# Altium footprint library Selex_PCBLib.PcbLib: 388 footprints (part 5 of 25)
Each footprint in its own frame and in the unit in brackets; x right, y up, seen from the top. Pads: shape width x height; smd on the part's side, far side on the other; paste and mask are expansions set on the pad; w line width, h text height; cw(c..) or ccw(c..) is an arc to the next point about the centre after c.
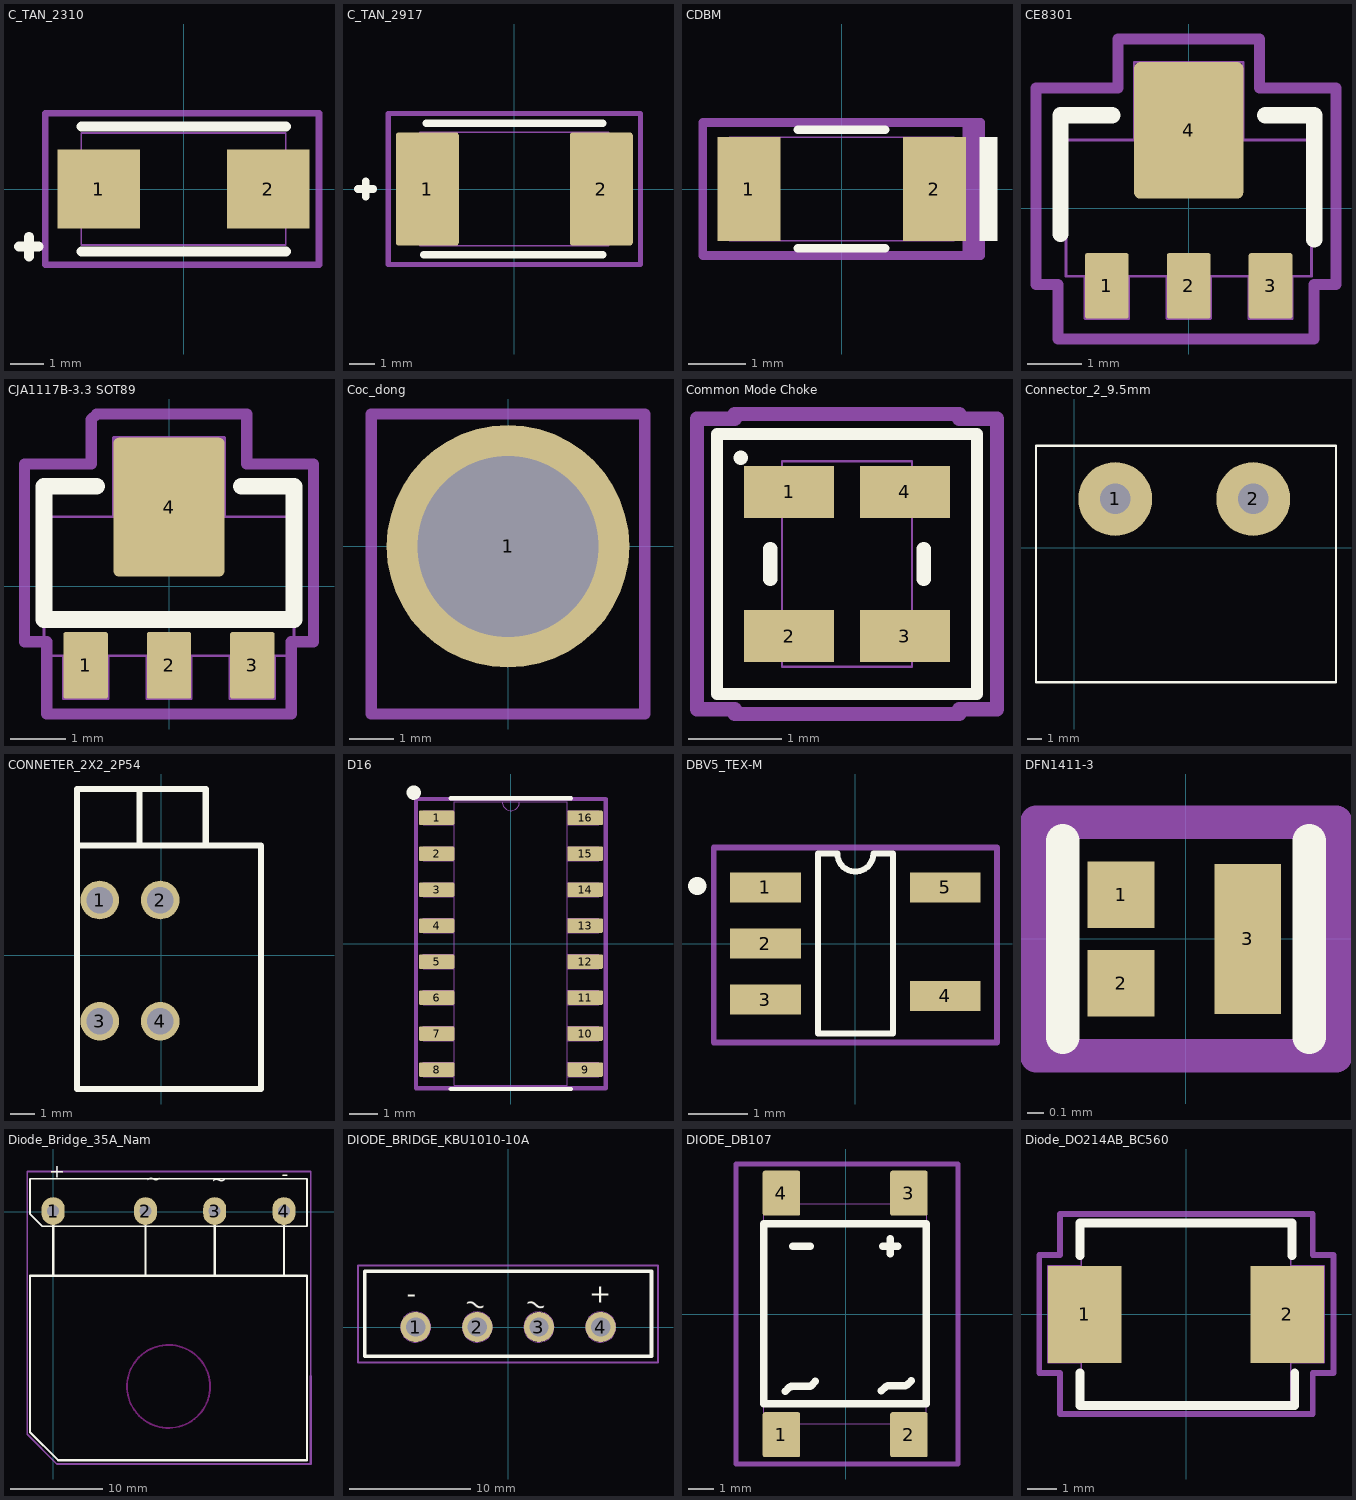
[diagram p4: the footprints below, top view; thin cyan lines are the x and y axes]

## C_TAN_2310 [mm] "Tantalum Capacitor 2310"
pads (2):
  rect 2.5x2.4 smd mask+0.1: 1(-2.585,0) 2(2.565,0)
Top Overlay:
  lines w0.3: -5,-1.75 -4.4,-1.75 ; -4.7,-2.05 -4.7,-1.45 ; -3.1,-1.9 3.1,-1.9 ; -3.1,1.9 3.1,1.9
Mechanical 1:
  lines w0.05: -3.11,-1.7 3.09,-1.7 3.09,1.7 -3.11,1.7 -3.11,-1.7
Mechanical 15:
  lines w0.2: -4.2,-2.3 -4.2,2.3 4.1,2.3 4.1,-2.3 -4.2,-2.3
3D body "CAPTAN6032.step": height 2.8, standoff 0, extent -3.16,-1.75 3.14,1.75

## C_TAN_2917 [mm] "Tantalum Capacitor 2917"
pads (2):
  rrect10% 2.5x4.5 smd mask+0.1: 1(-3.45,0) 2(3.45,0)
Top Overlay:
  lines w0.3: -6.2,0 -5.6,0 ; -5.9,-0.3 -5.9,0.3 ; -3.6,-2.6 3.5,-2.6 ; -3.5,2.6 3.5,2.6
Mechanical 1:
  lines w0.05: -3.75,-2.25 -3.75,2.25 3.75,2.25 3.75,-2.25 -3.75,-2.25
Mechanical 15:
  lines w0.2: -5,-3 -5,3 5,3 5,-3 -5,-3
3D body "CAPTAN7343.step": height 4, standoff 0, extent -3.8,-2.3 3.8,2.3

## CDBM [mil]
pads (2):
  rect 43x71 smd paste+0 mask+0: 1(-63.5,0) 2(63.5,0)
Top Overlay:
  region: 94.49,35.43 94.49,-35.43 106.3,-35.43 106.3,35.43
  lines w6: -29.89,-40.5 29.89,-40.5 ; -29.89,40.5 29.89,40.5
Mechanical 13:
  lines w1: -61,-17.75 -43.25,-35.5 ; -61,17.75 -43.25,35.5 ; -61,-35.5 -61,35.5 ; -61,-35.5 61,-35.5 ; -61,-35.5 -77,-35.5 -77,35.5 -61,35.5 ; -61,-35.5 -61,35.5 ; -61,35.5 61,35.5 ; 61,-35.5 61,35.5 ; 61,-35.5 77,-35.5 77,35.5 61,35.5 ; 61,-35.5 61,35.5
Mechanical 15:
  region: 95,45.5 83,45.5 83,-45.5 95,-45.5
  lines w6: -95,-45.5 -71,-45.5 71,-45.5 95,-45.5 95,45.5 71,45.5 -71,45.5 -95,45.5 -95,-45.5
3D body "CDBM.step": height 32.24, standoff 0, extent -77.01,-35.51 77.01,35.51

## CE8301 [mm] "IC BOOST DC-DC, SOT-89"
height 1.6
pads (4):
  rrect10% 0.8x1.2 smd mask+0.05: 1(-1.5,-1.425) 2(0,-1.425) 3(1.5,-1.425)
  rrect10% 2x2.5 smd mask+0.05: 4(0,1.425)
Top Overlay:
  lines w0.3: -2.35,-0.475 -2.35,1.7 -1.4,1.7 ; 1.4,1.7 2.3,1.7 2.3,-0.575
Mechanical 1:
  lines w0.05: -1.9,-1.25 -1.9,-2.025 -1.1,-2.025 -1.1,-1.25 ; -1,1.25 -1,2.675 1,2.675 1,1.25 ; -0.4,-1.25 -0.4,-2.025 0.4,-2.025 0.4,-1.25 ; 1.1,-1.25 1.1,-2.025 1.9,-2.025 1.9,-1.25 ; -2.25,-1.25 -2.25,1.25 2.25,1.25 2.25,-1.25 -2.25,-1.25
Mechanical 15:
  lines w0.2: -2.8,-1.4 -2.8,2.2 -1.3,2.2 -1.3,3.1 0,3.1 1.3,3.1 1.3,2.2 2.7,2.2 2.7,-1.4 2.3,-1.4 2.3,-2.4 -2.4,-2.4 -2.4,-1.4 -2.8,-1.4
3D body "CircuitWorks-SOT-89.step": height 1.5, standoff 0, extent -2.25,-1.725 2.25,2.275

## CJA1117B-3.3 SOT89 [mm] "SOT89, SMD"
pads (4):
  rrect10% 0.8x1.2 smd mask+0.05: 1(-1.5,-1.425) 2(0,-1.425) 3(1.5,-1.425)
  rrect10% 2x2.5 smd mask+0.05: 4(0,1.425)
Top Overlay:
  lines w0.3: -2.25,-0.6 2.25,-0.6 ; -2.25,-0.575 -2.25,1.8 -1.3,1.8 ; 1.3,1.8 2.25,1.8 2.25,-0.575
Mechanical 1:
  lines w0.05: -1.9,-1.25 -1.9,-2.025 -1.1,-2.025 -1.1,-1.25 ; -1,1.25 -1,2.675 1,2.675 1,1.25 ; -0.4,-1.25 -0.4,-2.025 0.4,-2.025 0.4,-1.25 ; 1.1,-1.25 1.1,-2.025 1.9,-2.025 1.9,-1.25 ; -2.25,-1.25 2.25,-1.25 2.25,1.25 -2.25,1.25 -2.25,-1.25
Mechanical 15:
  lines w0.2: -2.6,-1 -2.6,2.2 -1.4,2.2 -1.4,3 -1.3,3.1 1.4,3.1 1.4,2.2 2.6,2.2 2.6,-1 2.2,-1 2.2,-2.3 -2.2,-2.3 -2.2,-1 -2.6,-1
3D body "CircuitWorks-SOT-89.step": height 1.5, standoff 0, extent -2.25,-1.725 2.25,2.275

## Coc_dong [mm]
pads (1):
  round 5.5 hole 4.1: 1(0,0)
Mechanical 7:
  lines w0.254: -3.1,-3.8 -3.1,3 3.1,3 3.1,-3.8 -3.1,-3.8
3D body "terminal-Body.step": height 11, standoff -1.2, extent -2.5,-3.5 2.5,2.5

## Common Mode Choke [mil]
pads (4):
  rect 38x22 smd paste+0 mask+0: 1(-124.5,145.5) 2(-124.5,84.5) 3(-75.5,84.5) 4(-75.5,145.5)
Top Overlay:
  lines w5: -155,60 -45,60 -45,170 -155,170 -155,60
  lines w6: -145,159.95 ccw(c-148,160) -145,160 ; -132.5,108.6 -132.5,121.4 ; -67.5,108.6 -67.5,121.4
Mechanical 13:
  lines w1: -127.5,71.5 -72.5,71.5 -72.5,158.5 -127.5,158.5 -127.5,71.5
Mechanical 15:
  lines w6: -163.5,53.5 -163.5,176.5 -147.5,176.5 -147.5,178.5 -52.5,178.5 -52.5,176.5 -36.5,176.5 -36.5,53.5 -52.5,53.5 -52.5,51.5 -147.5,51.5 -147.5,53.5 -163.5,53.5
3D body "IND_BOURNS_SRF2012A.step": height 55.12, standoff 0, extent -127.48,71.5 -72.52,158.51

## Connector_2_9.5mm [mm]
pads (2):
  round 5.08 hole 2.1: 1(2.8,3.35) 2(12.3,3.35)
Top Overlay:
  lines w0.167: -2.65,-9.25 18,-9.25 18,7 -2.65,7 -2.65,-9.25
3D body "hb9500_asm.stp": height 21.04, standoff -4, extent -2.65,-9.2 17.95,7

## CONNETER_2X2_2P54 [mm]
pads (4):
  round 1.6 hole 1.1: 1(-2.54,2.286) 2(-0.03,2.286) 3(-2.54,-2.734) 4(-0.03,-2.734)
Top Overlay:
  lines w0.254: -0.889,4.572 -0.889,6.883 ; 1.803,4.547 1.854,4.597 1.854,6.858 1.854,6.883 -3.48,6.883 -3.48,4.547 ; -3.48,4.547 4.14,4.547 4.14,-5.537 -3.48,-5.537 -3.48,4.547
3D body "2.54.stp": height 13.5, standoff -3.7, extent -3.454,-5.64 4.126,6.96

## D16 [mil]
pads (16):
  rrect20% 49.5x20 smd paste+0 mask+2.76: 1(-103.25,175) 2(-103.25,125) 3(-103.25,75) 4(-103.25,25) 5(-103.25,-25) 6(-103.25,-75) 7(-103.25,-125) 8(-103.25,-175) 9(103.25,-175) 10(103.25,-125) 11(103.25,-75) 12(103.25,-25) 13(103.25,25) 14(103.25,75) 15(103.25,125) 16(103.25,175)
Top Overlay:
  circle w10: c-135,210 r5
  lines w6: -83.5,-202 83.5,-202 ; -83.5,202 83.5,202
Mechanical 13:
  lines w0: -12,197 ccw(c0,197) 12,197
  lines w1: -122,115 -78.5,115 -78.5,135 -122,135 ; -122,165 -78.5,165 -78.5,185 -122,185 ; -122,-185 -78.5,-185 -78.5,-165 -122,-165 -122,-185 ; -122,-135 -78.5,-135 -78.5,-115 -122,-115 -122,-135 ; -122,-85 -78.5,-85 -78.5,-65 -122,-65 -122,-85 ; -122,-35 -78.5,-35 -78.5,-15 -122,-15 -122,-35 ; -122,15 -78.5,15 -78.5,35 -122,35 -122,15 ; -122,65 -78.5,65 -78.5,85 -122,85 -122,65 ; -78.5,-197 -78.5,197 78.5,197 78.5,-197 -78.5,-197 ; 78.5,-185 122,-185 122,-165 78.5,-165 78.5,-185 ; 78.5,-135 122,-135 122,-115 78.5,-115 78.5,-135 ; 78.5,-85 122,-85 122,-65 78.5,-65 78.5,-85 ; 78.5,-35 122,-35 122,-15 78.5,-15 78.5,-35 ; 78.5,15 122,15 122,35 78.5,35 78.5,15 ; 78.5,65 122,65 122,85 78.5,85 78.5,65 ; 78.5,115 122,115 122,135 78.5,135 78.5,115 ; 78.5,165 122,165 122,185 78.5,185 78.5,165
Mechanical 15:
  lines w6: -132,-201 -82.5,-201 82.5,-201 132,-201 132,201 82.5,201 -82.5,201 -132,201 -132,-201
3D body "D16.step": height 69.09, standoff 0, extent -122,-197 122.01,197.02

## DBV5_TEX-M [mil]
pads (5):
  rect 47.24x20 smd: 1(-60,37.4) 2(-60,0) 3(-60,-37.4) 4(60,-35) 5(60,37.4)
Top Overlay:
  lines w3.94: -25,-60 25,-60 25,60 12,60 cw(c0,60) -12,60 -25,60 -25,-60
  lines w11.81: -105.67,38.35 -105.31,38.39
Mechanical 7:
  lines w3.94: -94.49,-65.94 -94.49,63.98 94.49,63.98 94.49,-65.94 -94.49,-65.94
3D body "SOT23-5_STM.step": height 57.09, standoff 0, extent -59.01,-59.01 59.02,59.02

## DFN1411-3 [mm]
pads (3):
  rect 0.4x0.4 smd: 1(-0.39,0.265) 2(-0.39,-0.265)
  rect 0.4x0.9 smd: 3(0.37,0)
Top Overlay:
  lines w0.2: -0.74,-0.59 -0.74,0.59 ; 0.74,-0.59 0.74,0.59
Mechanical 15:
  lines w0.2: -0.9,-0.7 0.9,-0.7 0.9,0.7 -0.9,0.7 -0.9,-0.7
3D body: height 0.5, standoff 0, extent -0.74,-0.59 0.74,0.59

## Diode_Bridge_35A_Nam [mm]
pads (4):
  oval 2.5x3 hole 1.3: 1(0,0.1) 2(10,0.1) 3(17.5,0.1) 4(25,0.1)
Top Overlay:
  lines w0.2: -0.3,-1.55 -1.2,-1.55 ; -1.2,-1.55 -2.5,-0.25 -2.5,3.6 27.5,3.6 27.5,-1.55 -1.2,-1.55
  lines w0.25: -2.5,-6.95 -2.5,-23.85 0.55,-26.9 27.5,-26.9 27.5,-6.9 -2.5,-6.9 ; 0,-6.9 0,0.1 ; 10,-6.9 10,0.1 ; 17.5,-6.9 17.5,0.1 ; 25,-6.8 25,0.1
  text "~" at 17.1,2.8 h1.5
  text "~" at 10.05,2.9 h1.5
  text "-" at 24.75,3.4 h1.5
  text "+" at -0.4,3.7 h1.5
Keep-Out Layer:
  circle w0.2: c12.5,-18.9 r4.5
Mechanical 15:
  lines w0.2: 27.9,-27.3 0.4,-27.3 -2.8,-24.1 -2.8,4.4 27.9,4.4 27.9,2.2 27.9,-17.8
  lines w0.254: 27.9,-27.3 27.9,-17.8

## DIODE_BRIDGE_KBU1010-10A [mm]
pads (4):
  round 2.5 hole 1.6 mask+0.1: 1(-7.64,0.01) 2(-2.54,0.01) 3(2.56,0.01) 4(7.66,0.01)
Top Overlay:
  lines w0.3: -11.84,-2.39 11.86,-2.39 11.86,4.61 5.935,4.61 -5.915,4.61 -11.84,4.61 -11.84,-2.39
  text "-" at -8.39,2.01 h1.6
  text "~" at -3.79,1.51 h1.6
  text "~" at 1.21,1.51 h1.6
  text "+" at 6.71,2.01 h1.6
Mechanical 1:
  circle w0.05: c-7.64,0.01 r1.25
  circle w0.05: c-2.54,0.01 r1.25
  circle w0.05: c2.56,0.01 r1.25
  circle w0.05: c7.66,0.01 r1.25
  lines w0.05: -6.015,4.61 11.86,4.61 11.86,-2.49 -11.84,-2.49 -11.84,4.61 -5.915,4.61
  text "+" at 6.91,2.01 h1.6
  text "~" at 1.21,1.51 h1.6
  text "~" at -3.79,1.51 h1.6
  text "-" at -8.39,2.01 h1.6
Mechanical 15:
  lines w0.2: -12.4,-2.924 -12.4,5.1 12.4,5.1 12.4,-2.924 -12.4,-2.924
3D body "KBU1010a.step": height 18.65, standoff -23.65, extent -11.59,-2.44 11.61,4.51

## DIODE_DB107 [mm]
pads (4):
  rrect10% 1.5x1.8 smd mask+0.05: 1(-2.57,-4.83) 2(2.53,-4.83) 3(2.53,4.83) 4(-2.57,4.83)
Top Overlay:
  lines w0.3: -2.42,-3.1 -2.255,-2.935 cw(c-2.17,-3.021) -2.17,-2.9 -1.47,-2.9 ccw(c-1.47,-2.779) -1.385,-2.865 -1.22,-2.7 ; -2.12,2.7 -1.42,2.7 ; 1.43,-3.07 1.595,-2.905 ; 1.48,2.7 2.08,2.7 ; 1.68,-2.87 2.38,-2.87 ; 1.78,2.4 1.78,3 ; 2.465,-2.835 2.63,-2.67 ; -3.27,-3.6 -3.27,3.6 3.23,3.6 3.23,-3.6 -3.27,-3.6
Mechanical 1:
  lines w0.05: -3.27,-4.4 -3.27,4.4 3.23,4.4 3.23,-4.4 -3.27,-4.4
Mechanical 15:
  lines w0.2: -4.4,-6 -4.4,6 1.8,6 4.5,6 4.5,-6 -0.1,-6 -4.4,-6
3D body "User Library-DB107S  DB-S.STEP": height 2.66, standoff 0, extent -4.12,-5.14 4.2,5.26

## Diode_DO214AB_BC560 [mm]
pads (2):
  rect 2.5x3.3 smd: 1(-3.46,-0.01) 2(3.44,-0.01)
Top Overlay:
  lines w0.3: -3.61,-2.01 -3.61,-3.11 3.49,-3.11 3.69,-3.11 3.69,-2.01 ; -3.61,1.99 -3.61,3.09 3.59,3.09 3.59,1.99
Mechanical 1:
  lines w0.05: -3.565,-1.66 -4.71,-1.66 -4.71,1.64 -3.565,1.64 ; 3.545,-1.66 4.69,-1.66 4.69,1.64 3.545,1.64 ; -3.565,-3.12 -3.565,3.1 3.545,3.1 3.545,-3.12 -3.565,-3.12
Mechanical 15:
  lines w0.2: -5,-2 -4.3,-2 -4.3,-3.4 4.3,-3.4 4.3,-2 5,-2 5,2 4.3,2 4.3,3.4 -4.3,3.4 -4.3,2 -5,2 -5,-2
3D body "do214ab.step": height 2.65, standoff 0.01, extent -4.074,-3.16 4.054,3.14